# Altium footprint library BaseLib.PcbLib: 62 footprints (part 3 of 4)
Each footprint in its own frame and in the unit in brackets; x right, y up, seen from the top. Pads: shape width x height; smd on the part's side, far side on the other; paste and mask are expansions set on the pad; w line width, h text height; cw(c..) or ccw(c..) is an arc to the next point about the centre after c.
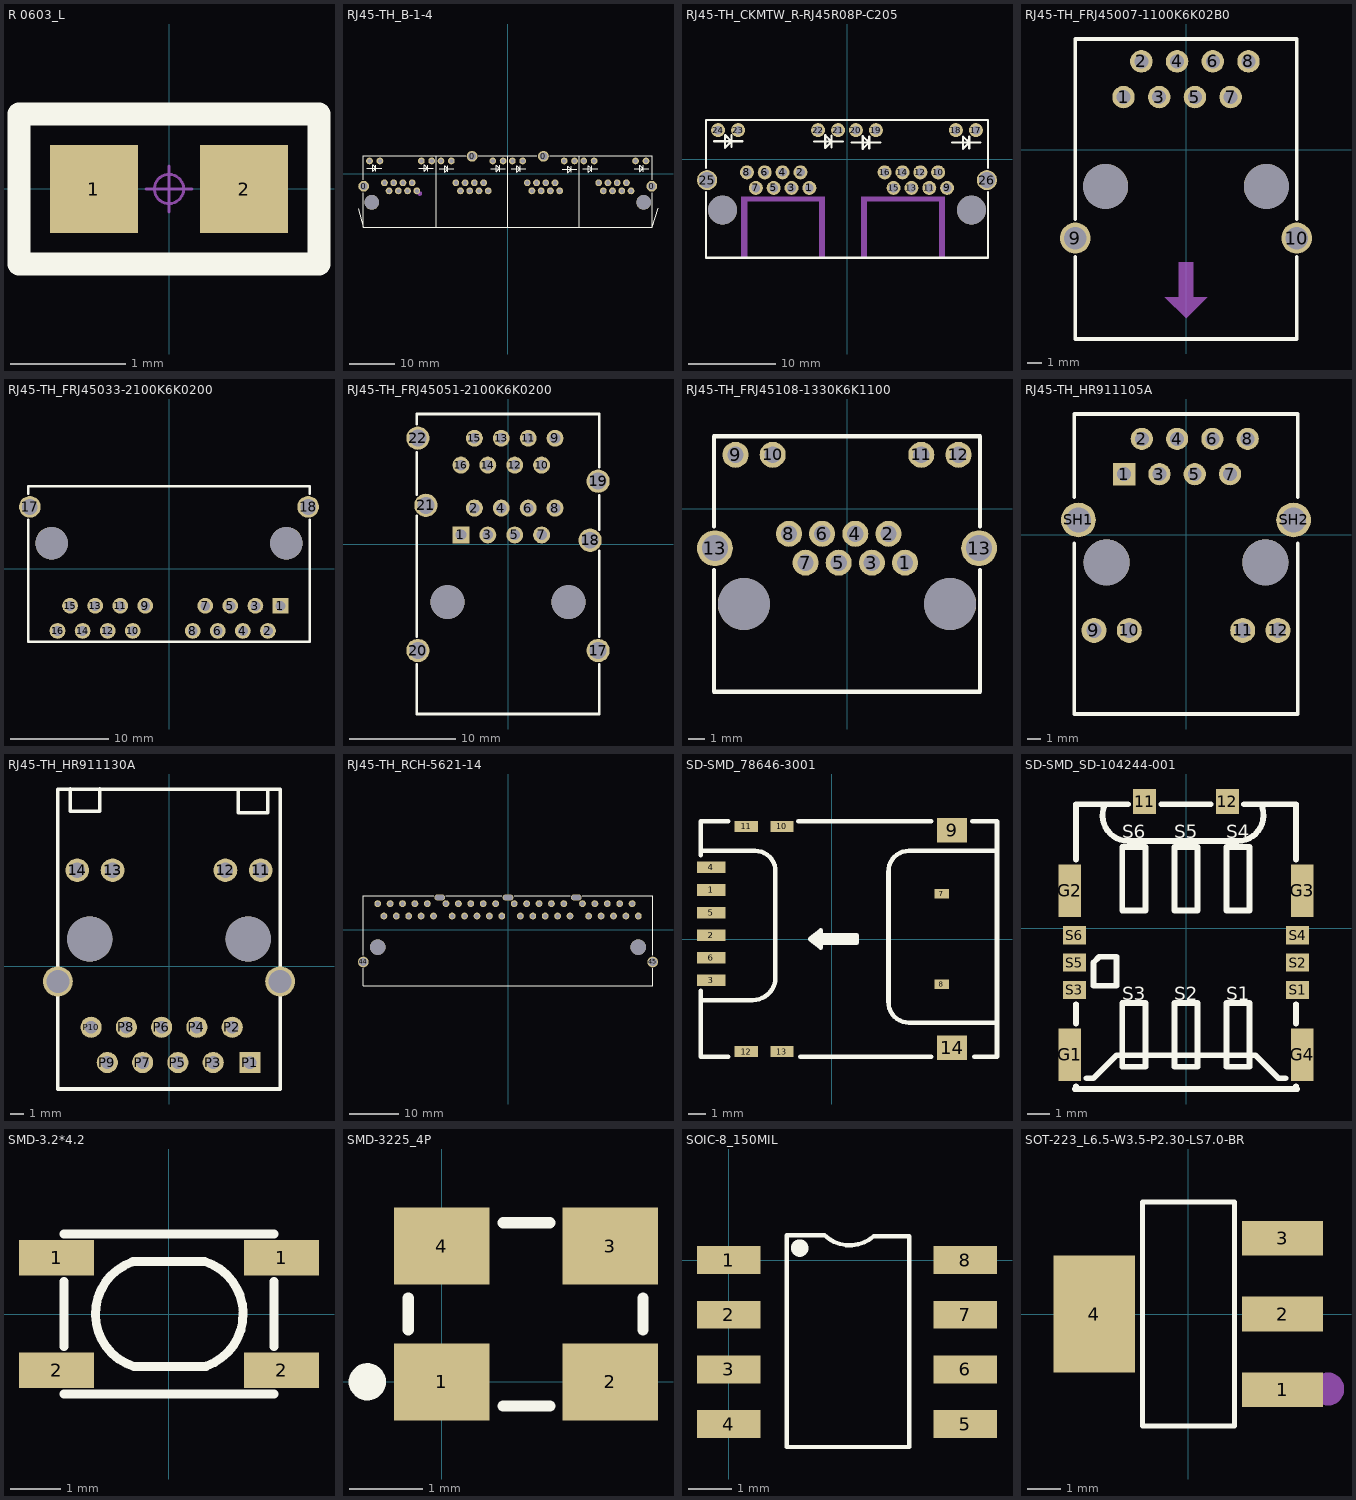
[diagram p2: the footprints below, top view; thin cyan lines are the x and y axes]

## R 0603_L [mil] "1/10W贴片电阻                 淘宝ID:黄晶宝石"
height 177.17
pads (2):
  rect 30x30 smd: 1(-25.59,0) 2(25.59,0)
Top Overlay:
  lines w8: -51.18,-25.59 -51.18,25.59 51.18,25.59 51.18,-25.59 -51.18,-25.59
Mechanical 15:
  circle w1: c0,0 r5
  lines w1: -7.87,0 7.87,0 ; 0,-7.87 0,7.87
3D body "R 0603.STEP": height 15.79, standoff -0.13, extent -31.49,-15.74 31.5,15.75

## RJ45-TH_B-1-4 [mm]
pads (54):
  round 2.4 hole 1.7: 0(-31.775,-2.79) 0(-7.875,3.81) 0(7.875,3.81) 0(31.775,-2.79)
  round 1.5 hole 0.9: 1(-20.055,-3.81) 2(-21.075,-2.03) 3(-22.095,-3.81) 3_8(-11.445,-2.03) 4(-23.115,-2.03) 5(-24.135,-3.81) 6(-25.155,-2.03) 7(-26.175,-3.81) 8(-27.195,-2.03) 9(-16.765,2.79) 10(-19.055,2.79) 11(-28.195,2.79) 12(-30.485,2.79) 13(-4.305,-3.81) 14(-5.325,-2.03) 15(-6.345,-3.81) 16(-7.365,-2.03) 17(-8.385,-3.81) 18(-9.405,-2.03) 19(-10.425,-3.81) 21(-1.015,2.79) 22(-3.305,2.79) 23(-12.445,2.79) 24(-14.735,2.79) 25(11.445,-3.81) 26(10.425,-2.03) 27(9.405,-3.81) 28(8.385,-2.03) 29(7.365,-3.81) 30(6.345,-2.03) 31(5.325,-3.81) 32(4.305,-2.03) 33(14.735,2.79) 34(12.445,2.794) 35(3.305,2.79) 36(1.015,2.79) 37(27.195,-3.81) 38(26.175,-2.03) 39(25.155,-3.81) 40(24.135,-2.03) 41(23.115,-3.81) 42(22.095,-2.03) 43(21.075,-3.81) 44(20.055,-2.03) 45(30.485,2.79) 46(28.195,2.79) 47(19.055,2.79) 48(16.765,2.79)
  round 3.25 hole 3.25 unplated: ""(-29.975,-6.35) ""(29.975,-6.35)
Top Overlay:
  lines w0.254: -33.026,-7.75 -31.877,-11.8 -31.877,-11.811 ; -31.877,-4.217 -31.877,-4.347 -31.877,-11.811 ; -31.877,-1.363 -31.877,3.953 -9.299,3.953 ; -31.063,1.2 -27.812,1.2 ; -29.107,1.15 -29.133,1.15 -29.818,0.464 -29.818,1.912 -29.107,1.2 ; -29.082,0.54 -29.082,1.886 ; -19.66,1.2 -16.409,1.2 ; -17.704,1.15 -17.73,1.15 -18.416,0.464 -18.416,1.912 -17.704,1.2 ; -17.679,0.54 -17.679,1.886 ; -15.75,-11.811 -15.75,3.937 ; -15.159,1.05 -11.908,1.05 ; -13.203,0.999 -13.229,0.999 -13.914,0.314 -13.914,1.761 -13.203,1.05 ; -13.178,0.39 -13.178,1.736 ; -6.451,3.953 -6.449,3.953 ; -6.449,3.937 6.45,3.937 ; -3.756,1.1 -0.505,1.1 ; -1.8,1.05 -1.826,1.05 -2.512,0.364 -2.512,1.812 -1.8,1.1 ; -1.775,0.44 -1.775,1.786 ; 0,-11.811 0,3.937 ; 0.745,1.05 3.996,1.05 ; 2.701,0.999 2.675,0.999 1.99,0.314 1.99,1.761 2.701,1.05 ; 2.726,0.39 2.726,1.736 ; 9.301,3.937 31.877,3.937 31.877,-1.363 ; 11.998,0.95 15.249,0.95 ; 13.954,0.899 13.928,0.899 13.242,0.214 13.242,1.661 13.954,0.95 ; 13.979,0.29 13.979,1.636 ; 15.75,-11.811 15.75,3.937 ; 16.549,1.05 19.8,1.05 ; 18.505,0.999 18.479,0.999 17.794,0.314 17.794,1.761 18.505,1.05 ; 18.53,0.39 18.53,1.736 ; 27.902,1.1 31.153,1.1 ; 29.858,1.05 29.832,1.05 29.146,0.364 29.146,1.812 29.858,1.1 ; 29.883,0.44 29.883,1.786 ; 31.877,-4.217 31.877,-4.347 31.877,-11.811 ; 33.141,-7.6 31.881,-11.811 31.877,-11.811 ; -31.877,-11.811 31.877,-11.811
Mechanical 15:
  circle w0.5: c-19.405,-4.401 r0.25

## RJ45-TH_CKMTW_R-RJ45R08P-C205 [mm]
pads (28):
  round 1.6 hole 1: 1(-4.305,-3.3) 2(-5.325,-1.52) 3(-6.344,-3.3) 4(-7.365,-1.52) 5(-8.385,-3.3) 6(-9.405,-1.52) 7(-10.424,-3.3) 8(-11.445,-1.52) 9(11.445,-3.3) 10(10.425,-1.52) 11(9.405,-3.3) 12(8.385,-1.52) 13(7.365,-3.3) 14(6.345,-1.52) 15(5.325,-3.3) 16(4.305,-1.52) 17(14.735,3.3) 18(12.445,3.3) 19(3.305,3.3) 20(1.015,3.3) 21(-1.015,3.3) 22(-3.305,3.3) 23(-12.445,3.3) 24(-14.735,3.3)
  round 2.3 hole 1.8: 25(-16,-2.41) 26(16,-2.41)
  round 3.3 hole 3.3 unplated: ""(-14.225,-5.84) ""(14.225,-5.84)
Top Overlay:
  lines w0.254: -16.13,-3.785 -16.13,-11.301 16.128,-11.301 16.128,-3.785 ; -16.13,-1.035 -16.13,4.447 16.128,4.447 16.128,-1.035 ; -15.198,2.03 -11.947,2.03 ; -13.242,1.979 -13.267,1.979 -13.953,1.294 -13.953,2.741 -13.242,2.03 ; -13.217,1.37 -13.217,2.716 ; -3.742,2.005 -0.491,2.005 ; -1.787,1.954 -1.812,1.954 -2.498,1.268 -2.498,2.716 -1.787,2.005 ; -1.761,1.344 -1.761,2.691 ; 0.55,1.903 3.801,1.903 ; 2.506,1.852 2.481,1.852 1.795,1.167 1.795,2.614 2.506,1.903 ; 2.531,1.243 2.531,2.589 ; 12.006,1.878 15.257,1.878 ; 13.961,1.827 13.936,1.827 13.25,1.141 13.25,2.589 13.961,1.878 ; 13.987,1.217 13.987,2.564
Mechanical 15:
  circle w1.5: c-14.225,-5.84 r0.75
  circle w1.5: c14.225,-5.84 r0.75
  region: 1.643,-11.303 1.643,-4.318 11.168,-4.318 11.168,-11.303 10.533,-11.303 10.533,-4.953 10.533,-4.826 2.278,-4.826 2.278,-11.303
  region: -12.065,-11.303 -12.065,-4.318 -2.54,-4.318 -2.54,-11.303 -3.175,-11.303 -3.175,-4.953 -3.175,-4.826 -11.43,-4.826 -11.43,-11.303

## RJ45-TH_FRJ45007-1100K6K02B0 [mm]
pads (12):
  round 1.6 hole 1: 1(-4.445,3.745) 2(-3.175,6.285) 3(-1.905,3.745) 4(-0.635,6.285) 5(0.635,3.745) 6(1.905,6.285) 7(3.175,3.745) 8(4.445,6.285)
  round 2.2 hole 1.6: 9(-7.875,-6.285) 10(7.875,-6.285)
  round 3.2 hole 3.2 unplated: ""(-5.715,-2.605) ""(5.715,-2.605)
Top Overlay:
  lines w0.254: -7.874,-7.616 -7.874,-13.462 7.874,-13.462 7.874,-7.616 ; -7.874,-4.954 -7.874,7.874 7.874,7.874 7.874,-4.954
Mechanical 15:
  circle w1.5: c5.715,-2.605 r0.75
  circle w1.5: c-5.715,-2.605 r0.75
  region: -1.5,-10.5 1.5,-10.5 0,-12
  region: 0,-10.5 -0.5,-10.5 -0.5,-8 0.5,-8 0.5,-10.5

## RJ45-TH_FRJ45033-2100K6K0200 [mm]
pads (20):
  rect 1.6x1.6 hole 1: 1(11.295,-3.745)
  round 1.6 hole 1: 2(10.025,-6.285) 3(8.755,-3.745) 4(7.485,-6.285) 5(6.215,-3.745) 6(4.945,-6.285) 7(3.675,-3.745) 8(2.405,-6.285) 9(-2.405,-3.745) 10(-3.675,-6.285) 11(-4.945,-3.745) 12(-6.215,-6.285) 13(-7.485,-3.745) 14(-8.755,-6.285) 15(-10.025,-3.745) 16(-11.295,-6.285)
  round 2.2 hole 1.6: 17(-14.1,6.285) 18(14.1,6.285)
  round 3.3 hole 3.3 unplated: ""(-11.9,2.605) ""(11.9,2.605)
Top Overlay:
  lines w0.254: -14.25,4.962 -14.25,-7.366 14.224,-7.366 ; -14.25,7.608 -14.25,8.355 14.25,8.355 14.25,7.608 ; 14.25,-7.366 14.25,4.962
Mechanical 15:
  circle w1.5: c-11.9,2.605 r0.75
  circle w1.5: c11.9,2.605 r0.75

## RJ45-TH_FRJ45051-2100K6K0200 [mm]
pads (24):
  rect 1.6x1.6 hole 1: 1(-4.445,0.885)
  round 1.6 hole 1: 2(-3.175,3.425) 3(-1.905,0.885) 4(-0.635,3.425) 5(0.635,0.885) 6(1.905,3.425) 7(3.175,0.885) 8(4.445,3.425) 9(4.445,10.025) 10(3.175,7.485) 11(1.905,10.025) 12(0.635,7.485) 13(-0.635,10.025) 14(-1.905,7.485) 15(-3.175,10.025) 16(-4.445,7.485)
  round 2.2 hole 1.6: 17(8.515,-10.035) 18(7.755,0.385) 19(8.515,5.965) 20(-8.515,-10.035) 21(-7.755,3.685) 22(-8.515,10.035)
  round 3.2 hole 3.2 unplated: ""(-5.715,-5.465) ""(5.715,-5.465)
Top Overlay:
  lines w0.254: -8.625,-11.362 -8.625,-16.035 8.625,-16.035 8.625,-11.362 ; -8.625,-8.708 -8.625,2.678 ; -8.625,4.692 -8.625,8.708 ; -8.625,11.362 -8.625,12.315 8.625,12.315 8.625,7.292 ; 8.625,-8.708 8.625,-0.622 ; 8.625,1.392 8.625,4.638

## RJ45-TH_FRJ45108-1330K6K1100 [mm]
pads (16):
  round 1.6 hole 1: 1(3.57,-3.32) 2(2.55,-1.54) 3(1.53,-3.32) 4(0.51,-1.54) 5(-0.51,-3.32) 6(-1.53,-1.54) 7(-2.55,-3.32) 8(-3.57,-1.54) 9(-6.86,3.32) 10(-4.57,3.32) 11(4.57,3.32) 12(6.86,3.32)
  round 2.2 hole 1.6: 13(-8.13,-2.43) 13(8.13,-2.43)
  round 3.2 hole 3.2 unplated: ""(-6.35,-5.86) ""(6.35,-5.86)
Top Overlay:
  lines w0.254: -8.18,-3.76 -8.18,-11.26 8.18,-11.26 8.18,-3.76 ; -8.18,-1.1 -8.18,4.46 8.18,4.46 8.18,-1.1

## RJ45-TH_HR911105A [mm]
pads (16):
  rect 1.6x1.6 hole 1: 1(-4.45,4.355)
  round 1.6 hole 1: 2(-3.18,6.895) 3(-1.91,4.355) 4(-0.64,6.895) 5(0.63,4.355) 6(1.9,6.895) 7(3.17,4.355) 8(4.44,6.895)
  round 1.8 hole 1.1: 9(-6.625,-6.895) 10(-4.085,-6.895) 11(4.085,-6.895) 12(6.625,-6.895)
  round 2.5 hole 1.8: SH1(-7.745,1.055) SH2(7.745,1.055)
  round 3.3 hole 3.3 unplated: ""(-5.715,-1.995) ""(5.715,-1.995)
Top Overlay:
  lines w0.254: -8.05,-0.615 -8.05,-12.915 8.05,-12.915 8.05,-0.615 ; -8.05,2.685 -8.05,8.685 8.05,8.685 ; 8.05,2.685 8.05,8.685
Mechanical 15:
  circle w1.4: c5.715,-1.995 r0.7
  circle w1.4: c-5.715,-1.995 r0.7
  circle w0.2: c-5.03,4.96 r0.1

## RJ45-TH_HR911130A [mil]
pads (18):
  round 66.93 hole 43.31: 11(260,272.62) 12(160,272.62) 13(-160,272.62) 14(-260,272.62)
  rect 60x60 hole 35.83: P1(229.63,-272.62)
  round 60 hole 35.83: P2(179.1,-172.38) P3(125.2,-272.38) P4(79.1,-172.38) P5(25.2,-272.38) P6(-20.9,-172.38) P7(-74.8,-272.38) P8(-120.9,-172.38) P9(-174.8,-272.38) P10(-220.9,-172.38)
  round 85 hole 65: SHIELD0(-315,-42.48) SHIELD1(315,-42.48)
  round 127.95 hole 127.95 unplated: ""(-224.4,77.62) ""(224.4,77.62)
Top Overlay:
  lines w10: -279.53,502.82 -279.53,439.82 -196.85,439.82 -196.85,471.32 -196.85,502.82 ; 196.82,498.88 196.82,435.88 279.5,435.88 279.5,467.38 279.5,498.88 ; -315,-347.38 315,-347.38 315,502.62 -315,502.62 -315,-347.38
Mechanical 15:
  circle w59.05: c224.4,77.62 r29.53
  circle w59.05: c-224.4,77.62 r29.53

## RJ45-TH_RCH-5621-14 [mm]
pads (47):
  round 1.4 hole 0.915: 1(-26.67,5.335) 2(-25.4,2.795) 3(-24.13,5.335) 4(-22.86,2.795) 5(-21.59,5.335) 6(-20.32,2.795) 7(-19.05,5.335) 8(-17.78,2.795) 9(-16.51,5.335) 10(-15.24,2.795) 11(-12.7,5.335) 12(-11.43,2.795) 13(-10.16,5.335) 14(-8.89,2.795) 15(-7.62,5.335) 16(-6.35,2.795) 17(-5.08,5.335) 18(-3.81,2.795) 19(-2.54,5.335) 20(-1.27,2.795) 21(1.27,5.335) 22(2.54,2.795) 23(3.81,5.335) 24(5.08,2.795) 25(6.35,5.335) 26(7.62,2.795) 27(8.89,5.335) 28(10.16,2.795) 29(11.43,5.335) 30(12.7,2.795) 31(15.24,5.335) 32(16.51,2.795) 33(17.78,5.335) 34(19.05,2.795) 35(20.32,5.335) 36(21.59,2.795) 37(22.86,5.335) 38(24.13,2.795) 39(25.4,5.335) 40(26.67,2.795)
  oval 2.2x1.2 hole 1 slot 1.785 at 0 deg: 41(13.97,6.605) 42(0,6.605) 43(-13.97,6.605)
  round 2.2 hole 1.7: 44(-29.6,-6.605) 45(29.6,-6.605)
  round 3.2 hole 3.2 unplated: ""(-26.67,-3.555) ""(26.67,-3.555)
Top Overlay:
  lines w0.254: -29.6,-7.936 -29.6,-11.505 29.6,-11.505 29.6,-7.936 ; -29.6,-5.274 -29.6,6.985 -15.209,6.985 ; -12.731,6.985 -1.239,6.985 ; 1.239,6.985 12.731,6.985 ; 15.209,6.985 29.6,6.985 ; 29.6,-5.274 29.6,6.858

## SD-SMD_78646-3001 [mm]
pads (14):
  rect 1.6x0.65 smd: 1(-6.765,2.755) 2(-6.765,0.215) 3(-6.765,-2.325) 4(-6.765,4.025) 5(-6.765,1.485) 6(-6.765,-1.055)
  rect 0.8x0.54 smd: 7(6.185,2.54) 8(6.185,-2.54)
  rect 1.7x1.4 smd: 9(6.765,6.11) 14(6.765,-6.11)
  rect 1.3x0.6 smd: 10(-2.795,6.325) 11(-4.795,6.325) 12(-4.795,-6.325) 13(-2.795,-6.325)
Top Overlay:
  region: -0.6,0.4 -0.6,-0.402 -1.092,0.09
  lines w0.254: -7.346,-3.429 -4.425,-3.429 ccw(c-4.425,-2.159) -3.155,-2.159 -3.155,3.81 ccw(c-4.298,3.81) -4.298,4.953 -7.219,4.953 ; -7.346,-2.921 -7.346,-6.604 -5.822,-6.604 ; -7.346,4.699 -7.346,6.604 -5.822,6.604 ; -1.885,6.604 5.608,6.604 ; -1.758,-6.604 5.608,-6.604 ; -0.6,-0.2 1.4,-0.2 1.4,0.2 -0.6,0.2 -0.6,0 ; 1.4,0 -0.6,0 ; 7.894,6.604 9.291,6.604 9.291,-6.604 8.021,-6.604 ; 9.291,-4.699 4.338,-4.699 cw(c4.338,-3.556) 3.195,-3.556 3.195,3.81 cw(c4.338,3.81) 4.338,4.953 9.291,4.953 ; -0.6,0 -0.6,-0.5 -1.2,0 -0.6,0.5 -0.6,0.4 -0.6,0
Mechanical 15:
  region: -0.6,0.4 -1.2,0 -0.6,-0.4 -0.6,-0.2 1.4,-0.2 1.4,0.2 -0.6,0.2

## SD-SMD_SD-104244-001 [mm]
pads (12):
  rect 1x1.1 smd: 11(-1.82,5.56) 12(1.82,5.56)
  rect 1x2.3 smd: G1(-5.1,-5.56) G2(-5.1,1.64) G3(5.1,1.64) G4(5.1,-5.56)
  rect 1x0.8 smd: S1(4.9,-2.71) S2(4.9,-1.51) S3(-4.9,-2.71) S4(4.9,-0.31) S5(-4.9,-1.51) S6(-4.9,-0.31)
Top Overlay:
  lines w0.254: -4.88,-7.06 4.88,-7.06 ; -4.826,-7.06 -4.826,-6.941 ; -4.826,-4.179 -4.826,-3.341 ; -4.826,3.021 -4.826,5.44 -3.556,5.44 ; -4.369,-6.59 -4.064,-6.59 -3.048,-5.574 3.048,-5.574 4.064,-6.59 4.369,-6.59 ; -2.551,5.44 -3.556,5.44 ; -1.089,5.44 1.089,5.44 ; 2.551,5.44 3.302,5.44 ; 4.826,-7.06 4.826,-6.941 ; 4.826,-4.179 4.826,-3.341 ; 4.826,3.021 4.826,5.44 3.302,5.44 ; -3.556,5.44 ccw(c-2.53,4.958) -2.54,3.824 2.286,3.824 ccw(c2.261,4.967) 3.302,5.44 ; -4.064,-2.526 -3.048,-2.526 -3.048,-1.256 -3.81,-1.256 -4.064,-1.51 -4.064,-1.764 -4.064,-2.526 ; -2.794,-6.082 -2.794,-3.288 -1.778,-3.288 -1.778,-6.082 -2.794,-6.082 ; -2.794,0.776 -2.794,3.57 -1.778,3.57 -1.778,0.776 -2.794,0.776 ; -0.508,-6.082 -0.508,-3.288 0.508,-3.288 0.508,-6.082 -0.508,-6.082 ; -0.508,0.776 -0.508,3.57 0.508,3.57 0.508,0.776 -0.508,0.776 ; 1.778,-6.082 1.778,-3.288 2.794,-3.288 2.794,-6.082 1.778,-6.082 ; 1.778,0.776 1.778,3.57 2.794,3.57 2.794,0.776 1.778,0.776
  text "S6" at -2.794,3.958 h0.6
  text "S5" at -0.508,3.958 h0.6
  text "S4" at 1.778,3.958 h0.6
  text "S3" at -2.794,-3.154 h0.6
  text "S2" at -0.508,-3.154 h0.6
  text "S1" at 1.778,-3.154 h0.6

## SMD-3.2*4.2 [mm]
height 4.5
pads (4):
  rect 1.5x0.7 smd: 1(-2.25,1.125) 1(2.25,1.125) 2(-2.25,-1.125) 2(2.25,-1.125)
Top Overlay:
  lines w0.178: -2.1,-1.6 2.1,-1.6 ; -2.1,-0.65 -2.1,0.65 ; -2.1,1.6 2.1,1.6 ; -0.738,1.037 ccw(c-0.372,0) -0.7,-1.05 0.737,-1.05 ; -0.725,1.05 0.712,1.05 cw(c0.384,0) 0.75,-1.037 ; 2.1,-0.65 2.1,0.65
3D body: height 0.13, standoff 0, extent -2.735,-1.282 2.472,-0.901
3D body: height 0.13, standoff 0, extent -2.735,0.94 2.472,1.321
3D body: height 1.5, standoff 0.05, extent -2.1,-1.6 2.091,1.575
3D body: height 1.8, standoff 0.13, extent -1.306,-1.092 1.424,1.003

## SMD-3225_4P [mm]
pads (4):
  rect 1.3x1.05 smd: 1(0,0) 2(2.3,0) 3(2.3,1.85) 4(0,1.85)
Top Overlay:
  circle w0.254: c-1.016,0 r0.127
  lines w0.152: -0.457,0.711 -0.457,1.143 ; 0.838,-0.33 1.473,-0.33 ; 0.838,2.17 1.473,2.17 ; 2.743,0.711 2.743,1.143
3D body "OSC 3225-4.STEP": height 0.7, standoff -0.02, extent -0.457,-0.361 2.743,2.139

## SOIC-8_150MIL [mm]
pads (8):
  rect 1.473x0.65 smd: 1(0,0) 2(0,-1.27) 3(0,-2.54) 4(0,-3.81) 5(5.5,-3.81) 6(5.5,-2.54) 7(5.5,-1.27) 8(5.5,0)
Top Overlay:
  circle w0.305: c1.65,0.28 r0.05
  lines w0.1: 2.2,0.58 1.35,0.58 1.35,-4.345 4.2,-4.345 4.2,0.555 3.4,0.555 ; 2.225,0.58 ccw(c2.812,1.193) 3.374,0.557
3D body "SO-8.STEP": height 1.7, standoff 0, extent -0.3,-4.345 5.7,0.555

## SOT-223_L6.5-W3.5-P2.30-LS7.0-BR [mm]
pads (4):
  rect 2.465x1.05 smd: 1(2.857,-2.3) 2(2.857,0) 3(2.857,2.3)
  rect 2.465x3.54 smd: 4(-2.857,0)
Top Overlay:
  lines w0.152: -1.396,-3.401 1.396,-3.401 1.396,3.401 -1.396,3.401 -1.396,-3.401
Mechanical 15:
  circle w0.5: c4.229,-2.277 r0.25